# Altium footprint library lib_protel_HC_BOINA.PCBLIB: 726 footprints (part 6 of 46)
Each footprint in its own frame and in the unit in brackets; x right, y up, seen from the top. Pads: shape width x height; smd on the part's side, far side on the other; paste and mask are expansions set on the pad; w line width, h text height; cw(c..) or ccw(c..) is an arc to the next point about the centre after c.
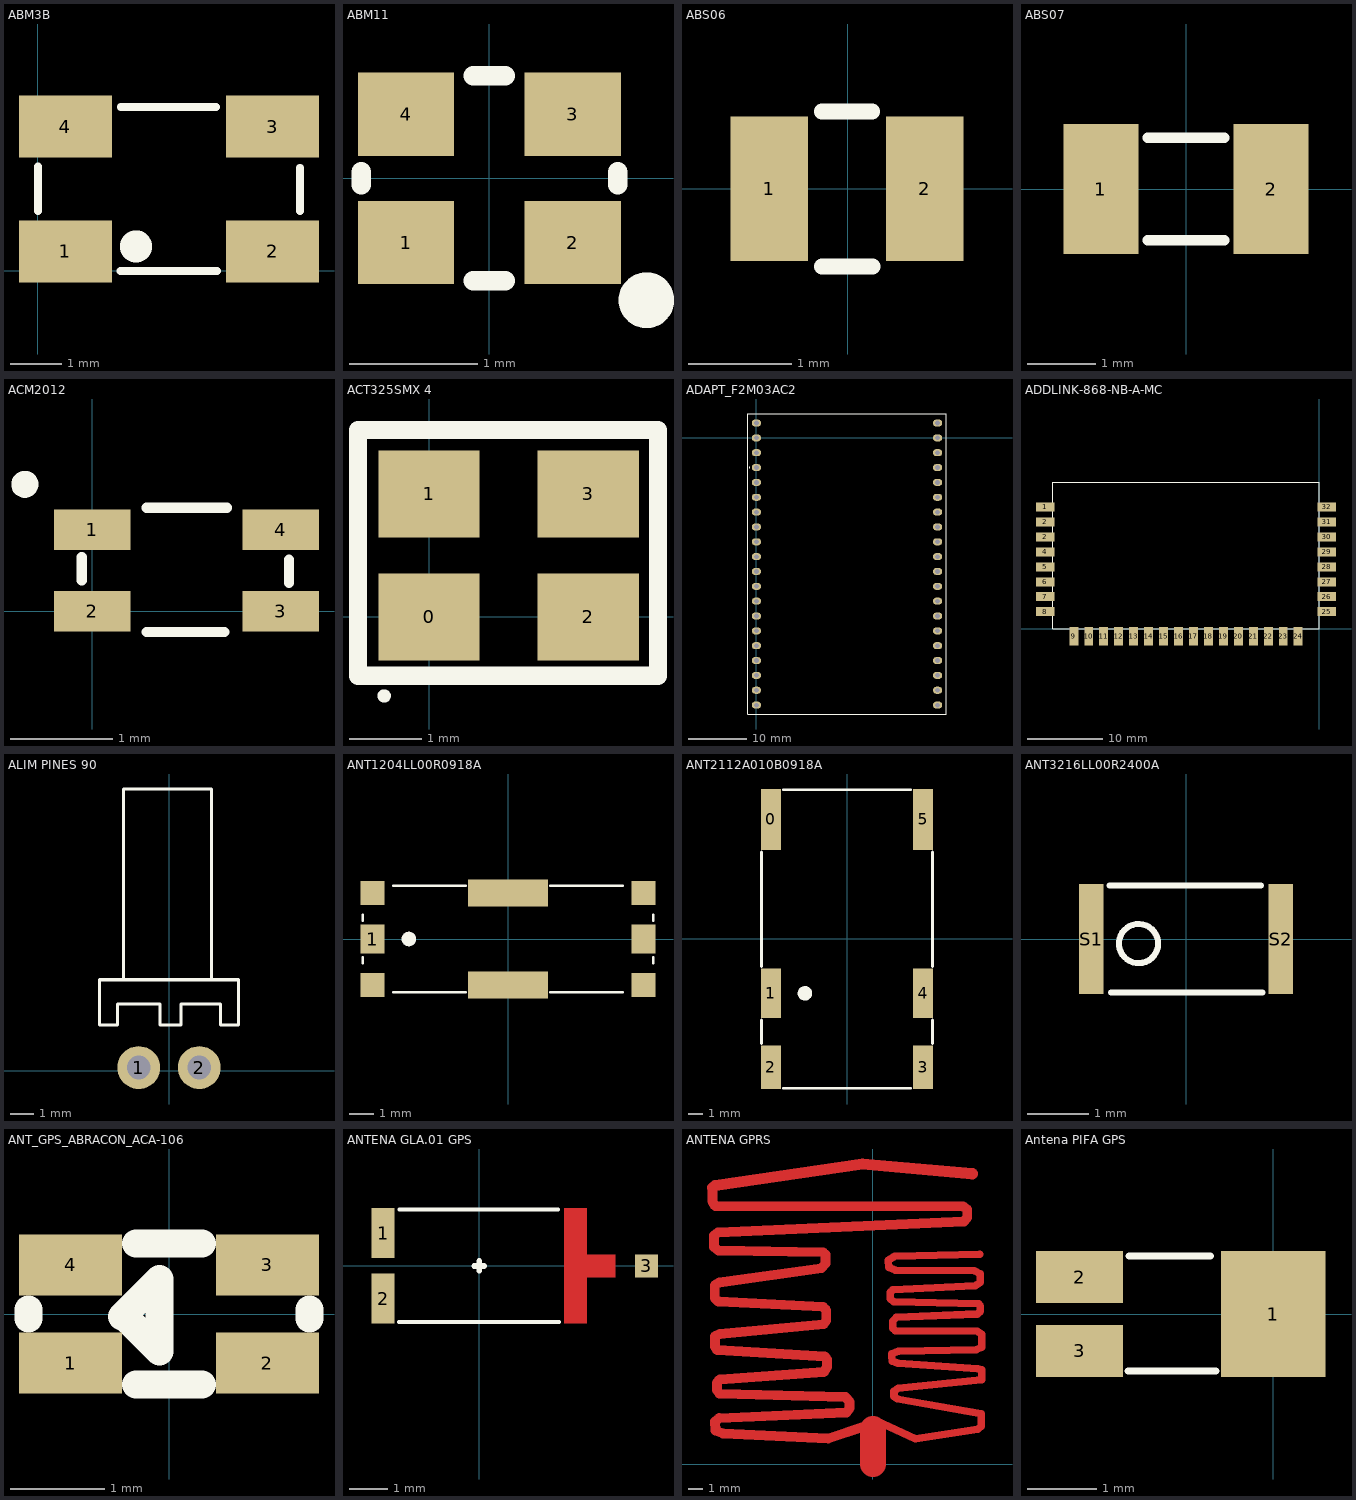
[diagram p5: the footprints below, top view; thin cyan lines are the x and y axes]

## ABM3B [mm] "CRISTAL ABRACON 30MHZ"
height 1.1
pads (4):
  rect 1.8x1.2 smd: 1(0.535,0.381) 2(4.545,0.381) 3(4.545,2.794) 4(0.535,2.794)
Top Overlay:
  lines w0.152: 0,1.16 0,2.02 ; 1.6,0 3.47,0 ; 1.605,3.175 3.45,3.175 ; 5.08,1.16 5.08,2
  lines w0.5: 1.96,0.476 cw(c1.9,0.476) 1.96,0.48
3D body "User Library-ABM3.STEP": height 1.3, standoff 0, extent -0.025,-0.125 5.175,3.275

## ABM11 [mm] "CRISTAL ABRACON 25MHZ"
height 0.59
pads (4):
  rect 0.75x0.65 smd: 1(-0.65,-0.5) 2(0.65,-0.5) 3(0.65,0.5) 4(-0.65,0.5)
Top Overlay:
  circle w0.254: c1.225,-0.95 r0.09
  lines w0.152: -1,-0.05 -1,0.05 ; -0.125,-0.8 0.125,-0.8 ; -0.125,0.8 0.125,0.8 ; 1,-0.05 1,0.05
3D body "ABM11.STEP": height 0.59, standoff 0, extent -1.003,-0.8 1.003,0.8

## ABS06 [mm] "CRISTAL 32.768KHZ"
height 0.6
pads (2):
  rect 0.75x1.4 smd: 1(-0.757,0) 2(0.747,0)
Top Overlay:
  lines w0.152: -0.25,0.75 0.24,0.75 ; -0.248,-0.753 0.242,-0.753
3D body "ABS06.STEP": height 0.61, standoff 0, extent -0.998,-0.597 1.009,0.597

## ABS07 [mm] "CRISTAL 32.768KHZ"
height 0.9
pads (2):
  rect 1.1x1.9 smd: 1(-1.25,0) 2(1.25,0)
Top Overlay:
  lines w0.152: -0.56,-0.75 0.56,-0.75 ; -0.56,0.75 0.56,0.75

## ACM2012 [mm] "ACM2012"
height 1.3
pads (4):
  rect 0.75x0.4 smd: 1(0,0.8) 2(0,0) 3(1.85,0) 4(1.85,0.8)
Top Overlay:
  circle w0.152: c-0.66,1.245 r0.057
  lines w0.1: -0.102,0.305 -0.102,0.533 ; 0.533,-0.203 1.295,-0.203 ; 0.533,1.016 1.321,1.016 ; 1.93,0.279 1.93,0.508

## ACT325SMX 4 [mm] "crystal 32mhz de 3.2mm x 2.5mm"
height 0.75
pads (4):
  rect 1.4x1.2 smd: 0(0,0) 1(0,1.7) 2(2.2,0) 3(2.2,1.7)
Top Overlay:
  circle w0.127: c-0.618,-1.09 r0.028
  lines w0.254: -0.98,-0.81 -0.98,2.58 3.16,2.58 3.16,-0.81 -0.98,-0.81

## ADAPT_F2M03AC2 [mm] "adaptador DIP del modulo bluetooth F2M03AC2"
pads (40):
  oval 1.6x1.2 hole 0.8: 1(0,-5.08) 2(0,-7.62) 3(0,-10.16) 4(0,-12.7) 5(0,-15.24) 6(0,-17.78) 7(0,-20.32) 8(0,-22.86) 9(0,-25.4) 10(0,-27.94) 11(0,-30.48) 12(0,-33.02) 13(0,-35.56) 14(0,-38.1) 15(0,-40.64) 16(0,-43.18) 17(0,-45.72) 18(30.988,-43.18) 19(30.988,-40.64) 20(30.988,-38.1) 21(30.988,-35.56) 22(30.988,-33.02) 23(30.988,-30.48) 24(30.988,-27.94) 25(30.988,-25.4) 26(30.988,-22.86) 27(30.988,-20.32) 28(30.988,-17.78) 29(30.988,-15.24) 30(30.988,-12.7) 31(30.988,-10.16) 32(30.988,-7.62) 33(30.988,-5.08) 34(30.988,-2.54) 35(0,-2.54) 36(30.988,0) 37(30.988,2.54) 38(0,0) 39(0,2.54) 40(30.988,-45.72)
Top Overlay:
  circle w0.127: c-1.19,-5.09 r0.028
  lines w0.127: -1.524,-47.244 -1.524,4.086 32.512,4.086 32.512,-47.244 -1.524,-47.244

## ADDLINK-868-NB-A-MC [mm]
pads (32):
  rect 2.5x1.2 smd: 1(-36.6,16.3) 2(-36.6,12.3) 2(-36.6,14.3) 4(-36.6,10.3) 5(-36.6,8.3) 6(-36.6,6.3) 7(-36.6,4.3) 8(-36.6,2.3) 25(1,2.3) 26(1,4.3) 27(1,6.3) 28(1,8.3) 29(1,10.3) 30(1,12.3) 31(1,14.3) 32(1,16.3)
  rect 1.2x2.5 smd: 9(-32.8,-1) 10(-30.8,-1) 11(-28.8,-1) 12(-26.8,-1) 13(-24.8,-1) 14(-22.8,-1) 15(-20.8,-1) 16(-18.8,-1) 17(-16.8,-1) 18(-14.8,-1) 19(-12.8,-1) 20(-10.8,-1) 21(-8.8,-1) 22(-6.8,-1) 23(-4.8,-1) 24(-2.8,-1)
Top Overlay:
  lines w0.127: -35.6,0 -35.6,19.6 0,19.6 0,0 -2.2,0 -35.6,0

## ALIM PINES 90 [mm] "CONECTOR ALIMENTACION A 90 GRADOS"
pads (2):
  round 1.8 hole 1: 1(-1.27,0.127) 2(1.27,0.127)
Top Overlay:
  lines w0.127: -1.905,3.81 -1.905,11.811 1.778,11.811 1.778,3.81 ; -2.921,1.905 -2.54,1.905 -2.159,1.905 -2.159,2.794 -0.381,2.794 -0.381,1.905 0.508,1.905 0.508,2.794 2.159,2.794 2.159,1.905 2.921,1.905 2.921,3.81 -2.54,3.81 -2.921,3.81 -2.921,1.905

## ANT1204LL00R0918A [mm]
height 0.4
pads (8):
  rect 1x1.2 smd: 1(-5.6,0) ""(5.6,0)
  rect 1x1 smd: ""(-5.6,-1.9) ""(-5.6,1.9) ""(5.6,-1.9) ""(5.6,1.9)
  rect 3.3x1.1 smd: ""(0,-1.9) ""(0,1.9)
Top Overlay:
  circle w0.3: c-4.1,0 r0.15
  lines w0.1: -6,-1 -6,-0.75 ; -6,0.75 -6,1 ; -4.75,-2.2 -1.75,-2.2 ; -4.75,2.2 -1.75,2.2 ; 1.75,-2.2 4.75,-2.2 ; 1.75,2.2 4.75,2.2 ; 6,-1 6,-0.75 ; 6,0.75 6,1
3D body: height 1.2, standoff 0, extent -6,-2.2 6,2.3

## ANT2112A010B0918A [mm]
height 0.5
pads (6):
  rect 1.4x4.2 smd: 0(-5.25,8.25) 5(5.25,8.25)
  rect 1.4x3.4 smd: 1(-5.25,-3.75) 4(5.25,-3.75)
  rect 1.4x3 smd: 2(-5.25,-8.85) 3(5.25,-8.85)
Top Overlay:
  circle w0.5: c-2.9,-3.75 r0.25
  lines w0.2: -5.9,-7.2 -5.9,-5.6 ; -5.9,-1.9 -5.9,6 ; -4.4,-10.3 4.4,-10.3 ; -4.4,10.3 4.4,10.3 ; 5.9,-7.2 5.9,-5.6 ; 5.9,-1.9 5.9,6
3D body: height 0.5, standoff 0, extent -5.9,-10.3 5.9,10.3

## ANT3216LL00R2400A [mm] "Antena Bluetooth 2.4 GHz"
height 1.35
pads (2):
  rect 0.4x1.8 smd: S1(-1.55,0) S2(1.55,0)
Top Overlay:
  circle w0.1: c-0.775,-0.075 r0.32
  lines w0.1: -1.25,0.875 1.225,0.875 ; -1.225,-0.875 1.25,-0.875
3D body: height 1.35, standoff 0, extent -1.576,-0.904 1.549,0.9

## ANT_GPS_ABRACON_ACA-106 [mm] "Antena GPS Abracom ACA-106"
height 1.2
pads (4):
  rect 1.1x0.65 smd: 1(-1.05,-0.525) 2(1.05,-0.525) 3(1.05,0.525) 4(-1.05,0.525)
Top Overlay:
  lines w0.3: -1.5,-0.05 -1.5,0.05 ; -0.35,-0.75 0.35,-0.75 ; -0.35,0.75 0.35,0.75 ; 1.5,-0.05 1.5,0.05 ; -0.5,-0.025 -0.475,-0.025 -0.1,-0.4 -0.1,0.375 -0.5,-0.025 ; -0.5,-0.025 -0.5,-0.025
3D body: height 1.2, standoff 0, extent -1.5,-0.75 1.5,0.75

## ANTENA GLA.01 GPS [mm]
height 0.5
pads (3):
  rect 0.6x1.3 smd: 1(-2.5,0.85) 2(-2.5,-0.85)
  rect 0.6x0.6 smd: 3(4.35,0)
Top Layer:
  rectangle: 2.8,-0.3 3.55,0.3
  rectangle: 2.2,-1.5 2.8,1.5
Top Overlay:
  lines w0.1: -2.08,-1.46 2.08,-1.46 ; -2.07,1.47 2.05,1.47
  lines w0.15: -0.125,0 0.125,0 ; 0,-0.125 0,0.125
Multi-Layer:
  pour cut-out: -2.5,1.5 4.05,1.5 4.05,-2.1 2.95,-2.1 2.95,-4 -3.05,-4 -3.05,-1.3 -2.475,-1.3 -2.475,-0.3 -3.05,-0.3 -3.05,0.5 -2.5,0.5
3D body: height 0.5, standoff 0, extent -2.5,-1.5 2.5,1.5

## ANTENA GPRS [mm]
Top Layer:
  lines w0.508: 0.178,2.946 2.896,1.702 7.087,2.362 7.315,2.54 7.315,3.404 1.651,4.394 1.422,4.572 1.422,4.928 1.702,5.105 7.341,5.69 7.341,6.375 7.087,6.426 1.702,6.807 1.295,6.96 1.27,7.264 1.27,7.442 1.727,7.62 6.985,7.722 7.341,7.899 7.341,8.763 7.036,8.966 1.524,8.992 1.346,9.169 1.346,9.652 1.575,9.906 7.036,10.135 7.264,10.312 7.264,10.668 7.137,10.82 1.422,10.947 1.168,11.151 1.168,11.608 1.346,11.76 6.909,12.04 7.239,12.268 7.239,12.852 6.858,13.056 1.524,13.106 1.067,13.284 1.041,13.767 1.473,14.046 7.214,14.173
  lines w0.66: -10.846,18.669 -10.846,17.755 -10.643,17.424 6.096,17.399 6.375,17.196 6.375,16.637 6.147,16.383 -10.465,15.646 -10.744,15.443 -10.744,14.656 -10.439,14.427 -3.378,14.3 -3.2,14.148 -3.2,13.538 -3.48,13.233 -10.363,12.268 -10.693,12.065 -10.693,11.201 -10.439,10.973 -3.378,10.617 -3.15,10.389 -3.15,9.677 -3.327,9.449 -10.338,8.788 -10.668,8.636 -10.668,7.925 -10.516,7.696 -3.251,7.264 -3.099,7.061 -3.099,6.553 -3.327,6.223 -10.338,5.715 -10.541,5.486 -10.541,5.004 -10.363,4.75 -1.854,4.521 -1.575,4.191 -1.575,3.759 -1.778,3.48 -10.389,3.099 -10.668,2.87 -10.643,2.261 -10.135,2.057 -3.023,1.727 -0.635,2.515
  lines w0.711: -10.846,18.669 -10.643,18.821
  lines w0.762: -10.643,18.821 -0.711,20.269 6.706,19.609
  lines w1.778: 0,0 0,2.362

## Antena PIFA GPS [mm]
height 1
pads (3):
  rect 1.5x1.8 smd paste+0.1 mask+0.1: 1(0,0)
  rect 1.25x0.74 smd paste+0.1 mask+0.1: 2(-2.775,0.53) 3(-2.775,-0.53)
Top Overlay:
  lines w0.1: -2.08,-0.82 -0.82,-0.82 ; -2.07,0.83 -0.9,0.83